# Altium footprint library SMD Active.PcbLib: 76 footprints (part 6 of 8)
Each footprint in its own frame and in the unit in brackets; x right, y up, seen from the top. Pads: shape width x height; smd on the part's side, far side on the other; paste and mask are expansions set on the pad; w line width, h text height; cw(c..) or ccw(c..) is an arc to the next point about the centre after c.
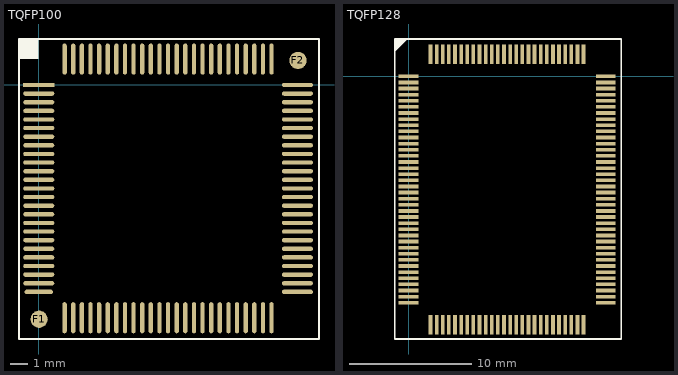
[diagram p5: the footprints below, top view; thin cyan lines are the x and y axes]

## TQFP100 [mm]
pads (102):
  rect 1.8x0.25 smd: 1(0,0)
  oval 1.8x0.25 smd: 2(0,-0.5) 3(0,-1) 4(0,-1.5) 5(0,-2) 6(0,-2.5) 7(0,-3) 8(0,-3.5) 9(0,-4) 10(0,-4.5) 11(0,-5) 12(0,-5.5) 13(0,-6) 14(0,-6.5) 15(0,-7) 16(0,-7.5) 17(0,-8) 18(0,-8.5) 19(0,-9) 20(0,-9.5) 21(0,-10) 22(0,-10.5) 23(0,-11) 24(0,-11.5) 51(15,-12) 52(15,-11.5) 53(15,-11) 54(15,-10.5) 55(15,-10) 56(15,-9.5) 57(15,-9) 58(15,-8.5) 59(15,-8) 60(15,-7.5) 61(15,-7) 62(15,-6.5) 63(15,-6) 64(15,-5.5) 65(15,-5) 66(15,-4.5) 67(15,-4) 68(15,-3.5) 69(15,-3) 70(15,-2.5) 71(15,-2) 72(15,-1.5) 73(15,-1) 74(15,-0.5) 75(15,0)
  oval 1.651x0.25 smd: 25(0,-12)
  oval 0.25x1.8 smd: 26(1.5,-13.5) 27(2,-13.5) 28(2.5,-13.5) 29(3,-13.5) 30(3.5,-13.5) 31(4,-13.5) 32(4.5,-13.5) 33(5,-13.5) 34(5.5,-13.5) 35(6,-13.5) 36(6.5,-13.5) 37(7,-13.5) 38(7.5,-13.5) 39(8,-13.5) 40(8.5,-13.5) 41(9,-13.5) 42(9.5,-13.5) 43(10,-13.5) 44(10.5,-13.5) 45(11,-13.5) 46(11.5,-13.5) 47(12,-13.5) 48(12.5,-13.5) 49(13,-13.5) 50(13.5,-13.5) 76(13.5,1.5) 77(13,1.5) 78(12.5,1.5) 79(12,1.5) 80(11.5,1.5) 81(11,1.5) 82(10.5,1.5) 83(10,1.5) 84(9.5,1.5) 85(9,1.5) 86(8.5,1.5) 87(8,1.5) 88(7.5,1.5) 89(7,1.5) 90(6.5,1.5) 91(6,1.5) 92(5.5,1.5) 93(5,1.5) 94(4.5,1.5) 95(4,1.5) 96(3.5,1.5) 97(3,1.5) 98(2.5,1.5) 99(2,1.5) 100(1.5,1.5)
  round 1 smd: F1(0.022,-13.586) F2(15.033,1.425)
Top Overlay:
  rectangle: -1.146,1.499 -0.025,2.667
  lines w0.127: -0.511,2.667 -1.146,2.032 -1.146,2.159 -0.638,2.667 -0.765,2.667 -1.146,2.286 -1.146,2.413 -0.892,2.667 -1.146,2.667 ; -1.146,2.667 -1.146,-14.732 16.253,-14.732 16.253,2.667 -1.146,2.667
3D body: height 1.02, standoff 0, extent 0.889,-12.598 14.097,0.61
3D body: height 0.3, standoff 0, extent -0.254,-0.143 0.305,0.162
3D body: height 0.64, standoff 0.3, extent 0.089,-0.143 0.914,0.162
3D body: height 0.64, standoff 0.3, extent 0.089,-0.643 0.914,-0.338
3D body: height 0.3, standoff 0, extent -0.254,-0.643 0.305,-0.338
3D body: height 0.64, standoff 0.3, extent 0.089,-1.143 0.914,-0.838
3D body: height 0.3, standoff 0, extent -0.254,-1.143 0.305,-0.838
3D body: height 0.64, standoff 0.3, extent 0.089,-1.643 0.914,-1.338
3D body: height 0.3, standoff 0, extent -0.254,-1.643 0.305,-1.338
3D body: height 0.64, standoff 0.3, extent 0.089,-2.143 0.914,-1.838
3D body: height 0.3, standoff 0, extent -0.254,-2.143 0.305,-1.838
3D body: height 0.64, standoff 0.3, extent 0.089,-2.643 0.914,-2.338
3D body: height 0.3, standoff 0, extent -0.254,-2.643 0.305,-2.338
3D body: height 0.3, standoff 0, extent -0.254,-5.643 0.305,-5.338
3D body: height 0.64, standoff 0.3, extent 0.089,-5.643 0.914,-5.338
3D body: height 0.3, standoff 0, extent -0.254,-5.143 0.305,-4.838
3D body: height 0.64, standoff 0.3, extent 0.089,-5.143 0.914,-4.838
3D body: height 0.3, standoff 0, extent -0.254,-4.643 0.305,-4.338
3D body: height 0.64, standoff 0.3, extent 0.089,-4.643 0.914,-4.338
3D body: height 0.3, standoff 0, extent -0.254,-4.143 0.305,-3.838
3D body: height 0.64, standoff 0.3, extent 0.089,-4.143 0.914,-3.838
3D body: height 0.3, standoff 0, extent -0.254,-3.643 0.305,-3.338
3D body: height 0.64, standoff 0.3, extent 0.089,-3.643 0.914,-3.338
3D body: height 0.64, standoff 0.3, extent 0.089,-3.143 0.914,-2.838
3D body: height 0.3, standoff 0, extent -0.254,-3.143 0.305,-2.838
3D body: height 0.3, standoff 0, extent -0.254,-8.643 0.305,-8.338
3D body: height 0.64, standoff 0.3, extent 0.089,-8.643 0.914,-8.338
3D body: height 0.3, standoff 0, extent -0.254,-8.143 0.305,-7.838
3D body: height 0.64, standoff 0.3, extent 0.089,-8.143 0.914,-7.838
3D body: height 0.3, standoff 0, extent -0.254,-7.643 0.305,-7.338
3D body: height 0.64, standoff 0.3, extent 0.089,-7.643 0.914,-7.338
3D body: height 0.3, standoff 0, extent -0.254,-7.143 0.305,-6.838
3D body: height 0.64, standoff 0.3, extent 0.089,-7.143 0.914,-6.838
3D body: height 0.3, standoff 0, extent -0.254,-6.643 0.305,-6.338
3D body: height 0.64, standoff 0.3, extent 0.089,-6.643 0.914,-6.338
3D body: height 0.64, standoff 0.3, extent 0.089,-6.143 0.914,-5.838
3D body: height 0.3, standoff 0, extent -0.254,-6.143 0.305,-5.838
3D body: height 0.3, standoff 0, extent -0.254,-11.643 0.305,-11.338
3D body: height 0.64, standoff 0.3, extent 0.089,-11.643 0.914,-11.338
3D body: height 0.3, standoff 0, extent -0.254,-11.143 0.305,-10.838
3D body: height 0.64, standoff 0.3, extent 0.089,-11.143 0.914,-10.838
3D body: height 0.3, standoff 0, extent -0.254,-10.643 0.305,-10.338
3D body: height 0.64, standoff 0.3, extent 0.089,-10.643 0.914,-10.338
3D body: height 0.3, standoff 0, extent -0.254,-10.143 0.305,-9.838
3D body: height 0.64, standoff 0.3, extent 0.089,-10.143 0.914,-9.838
3D body: height 0.3, standoff 0, extent -0.254,-9.643 0.305,-9.338
3D body: height 0.64, standoff 0.3, extent 0.089,-9.643 0.914,-9.338
3D body: height 0.64, standoff 0.3, extent 0.089,-9.143 0.914,-8.838
3D body: height 0.3, standoff 0, extent -0.254,-9.143 0.305,-8.838
3D body: height 0.64, standoff 0.3, extent 0.089,-12.143 0.914,-11.838
3D body: height 0.3, standoff 0, extent -0.254,-12.143 0.305,-11.838
3D body: height 0.3, standoff 0, extent 13.334,-13.738 13.639,-13.179
3D body: height 0.64, standoff 0.3, extent 13.334,-13.395 13.639,-12.57
3D body: height 0.3, standoff 0, extent 10.334,-13.738 10.639,-13.179
3D body: height 0.64, standoff 0.3, extent 10.334,-13.395 10.639,-12.57
3D body: height 0.64, standoff 0.3, extent 10.834,-13.395 11.139,-12.57
3D body: height 0.3, standoff 0, extent 10.834,-13.738 11.139,-13.179
3D body: height 0.64, standoff 0.3, extent 11.334,-13.395 11.639,-12.57
3D body: height 0.3, standoff 0, extent 11.334,-13.738 11.639,-13.179
3D body: height 0.64, standoff 0.3, extent 11.834,-13.395 12.139,-12.57
3D body: height 0.3, standoff 0, extent 11.834,-13.738 12.139,-13.179
3D body: height 0.64, standoff 0.3, extent 12.334,-13.395 12.639,-12.57
3D body: height 0.3, standoff 0, extent 12.334,-13.738 12.639,-13.179
3D body: height 0.64, standoff 0.3, extent 12.834,-13.395 13.139,-12.57
3D body: height 0.3, standoff 0, extent 12.834,-13.738 13.139,-13.179
3D body: height 0.3, standoff 0, extent 7.334,-13.738 7.639,-13.179
3D body: height 0.64, standoff 0.3, extent 7.334,-13.395 7.639,-12.57
3D body: height 0.64, standoff 0.3, extent 7.834,-13.395 8.139,-12.57
3D body: height 0.3, standoff 0, extent 7.834,-13.738 8.139,-13.179
3D body: height 0.64, standoff 0.3, extent 8.334,-13.395 8.639,-12.57
3D body: height 0.3, standoff 0, extent 8.334,-13.738 8.639,-13.179
3D body: height 0.64, standoff 0.3, extent 8.834,-13.395 9.139,-12.57
3D body: height 0.3, standoff 0, extent 8.834,-13.738 9.139,-13.179
3D body: height 0.64, standoff 0.3, extent 9.334,-13.395 9.639,-12.57
3D body: height 0.3, standoff 0, extent 9.334,-13.738 9.639,-13.179
3D body: height 0.64, standoff 0.3, extent 9.834,-13.395 10.139,-12.57
3D body: height 0.3, standoff 0, extent 9.834,-13.738 10.139,-13.179
3D body: height 0.3, standoff 0, extent 4.334,-13.738 4.639,-13.179
3D body: height 0.64, standoff 0.3, extent 4.334,-13.395 4.639,-12.57
3D body: height 0.64, standoff 0.3, extent 4.834,-13.395 5.139,-12.57
3D body: height 0.3, standoff 0, extent 4.834,-13.738 5.139,-13.179
3D body: height 0.64, standoff 0.3, extent 5.334,-13.395 5.639,-12.57
3D body: height 0.3, standoff 0, extent 5.334,-13.738 5.639,-13.179
3D body: height 0.64, standoff 0.3, extent 5.834,-13.395 6.139,-12.57
3D body: height 0.3, standoff 0, extent 5.834,-13.738 6.139,-13.179
3D body: height 0.64, standoff 0.3, extent 6.334,-13.395 6.639,-12.57
3D body: height 0.3, standoff 0, extent 6.334,-13.738 6.639,-13.179
3D body: height 0.64, standoff 0.3, extent 6.834,-13.395 7.139,-12.57
3D body: height 0.3, standoff 0, extent 6.834,-13.738 7.139,-13.179
3D body: height 0.3, standoff 0, extent 3.834,-13.738 4.139,-13.179
3D body: height 0.64, standoff 0.3, extent 3.834,-13.395 4.139,-12.57
3D body: height 0.3, standoff 0, extent 3.334,-13.738 3.639,-13.179
3D body: height 0.64, standoff 0.3, extent 3.334,-13.395 3.639,-12.57
3D body: height 0.3, standoff 0, extent 2.834,-13.738 3.139,-13.179
3D body: height 0.64, standoff 0.3, extent 2.834,-13.395 3.139,-12.57
3D body: height 0.3, standoff 0, extent 2.334,-13.738 2.639,-13.179
3D body: height 0.64, standoff 0.3, extent 2.334,-13.395 2.639,-12.57
3D body: height 0.3, standoff 0, extent 1.834,-13.738 2.139,-13.179
3D body: height 0.64, standoff 0.3, extent 1.834,-13.395 2.139,-12.57
3D body: height 0.64, standoff 0.3, extent 1.334,-13.395 1.639,-12.57
3D body: height 0.3, standoff 0, extent 1.334,-13.738 1.639,-13.179
3D body: height 0.3, standoff 0, extent 14.675,-2.662 15.234,-2.357
3D body: height 0.64, standoff 0.3, extent 14.066,-2.662 14.891,-2.357
3D body: height 0.64, standoff 0.3, extent 14.066,-2.162 14.891,-1.857
3D body: height 0.3, standoff 0, extent 14.675,-2.162 15.234,-1.857
3D body: height 0.64, standoff 0.3, extent 14.066,-1.662 14.891,-1.357
3D body: height 0.3, standoff 0, extent 14.675,-1.662 15.234,-1.357
3D body: height 0.64, standoff 0.3, extent 14.066,-1.162 14.891,-0.857
3D body: height 0.3, standoff 0, extent 14.675,-1.162 15.234,-0.857
3D body: height 0.64, standoff 0.3, extent 14.066,-0.662 14.891,-0.357
3D body: height 0.3, standoff 0, extent 14.675,-0.662 15.234,-0.357
3D body: height 0.64, standoff 0.3, extent 14.066,-0.162 14.891,0.143
3D body: height 0.3, standoff 0, extent 14.675,-0.162 15.234,0.143
3D body: height 0.3, standoff 0, extent 14.675,-5.662 15.234,-5.357
3D body: height 0.64, standoff 0.3, extent 14.066,-5.662 14.891,-5.357
3D body: height 0.64, standoff 0.3, extent 14.066,-5.162 14.891,-4.857
3D body: height 0.3, standoff 0, extent 14.675,-5.162 15.234,-4.857
3D body: height 0.64, standoff 0.3, extent 14.066,-4.662 14.891,-4.357
3D body: height 0.3, standoff 0, extent 14.675,-4.662 15.234,-4.357
3D body: height 0.64, standoff 0.3, extent 14.066,-4.162 14.891,-3.857
3D body: height 0.3, standoff 0, extent 14.675,-4.162 15.234,-3.857
3D body: height 0.64, standoff 0.3, extent 14.066,-3.662 14.891,-3.357
3D body: height 0.3, standoff 0, extent 14.675,-3.662 15.234,-3.357
3D body: height 0.64, standoff 0.3, extent 14.066,-3.162 14.891,-2.857
3D body: height 0.3, standoff 0, extent 14.675,-3.162 15.234,-2.857
3D body: height 0.3, standoff 0, extent 14.675,-8.662 15.234,-8.357
3D body: height 0.64, standoff 0.3, extent 14.066,-8.662 14.891,-8.357
3D body: height 0.64, standoff 0.3, extent 14.066,-8.162 14.891,-7.857
3D body: height 0.3, standoff 0, extent 14.675,-8.162 15.234,-7.857
3D body: height 0.64, standoff 0.3, extent 14.066,-7.662 14.891,-7.357
3D body: height 0.3, standoff 0, extent 14.675,-7.662 15.234,-7.357
3D body: height 0.64, standoff 0.3, extent 14.066,-7.162 14.891,-6.857
3D body: height 0.3, standoff 0, extent 14.675,-7.162 15.234,-6.857
3D body: height 0.64, standoff 0.3, extent 14.066,-6.662 14.891,-6.357
3D body: height 0.3, standoff 0, extent 14.675,-6.662 15.234,-6.357
3D body: height 0.64, standoff 0.3, extent 14.066,-6.162 14.891,-5.857
3D body: height 0.3, standoff 0, extent 14.675,-6.162 15.234,-5.857
3D body: height 0.3, standoff 0, extent 14.675,-11.662 15.234,-11.357
3D body: height 0.64, standoff 0.3, extent 14.066,-11.662 14.891,-11.357
3D body: height 0.64, standoff 0.3, extent 14.066,-11.162 14.891,-10.857
3D body: height 0.3, standoff 0, extent 14.675,-11.162 15.234,-10.857
3D body: height 0.64, standoff 0.3, extent 14.066,-10.662 14.891,-10.357
3D body: height 0.3, standoff 0, extent 14.675,-10.662 15.234,-10.357
3D body: height 0.64, standoff 0.3, extent 14.066,-10.162 14.891,-9.857
3D body: height 0.3, standoff 0, extent 14.675,-10.162 15.234,-9.857
3D body: height 0.64, standoff 0.3, extent 14.066,-9.662 14.891,-9.357
3D body: height 0.3, standoff 0, extent 14.675,-9.662 15.234,-9.357
3D body: height 0.64, standoff 0.3, extent 14.066,-9.162 14.891,-8.857
3D body: height 0.3, standoff 0, extent 14.675,-9.162 15.234,-8.857
3D body: height 0.64, standoff 0.3, extent 14.066,-12.162 14.891,-11.857
3D body: height 0.3, standoff 0, extent 14.675,-12.162 15.234,-11.857
3D body: height 0.3, standoff 0, extent 3.853,1.191 4.158,1.75
3D body: height 0.64, standoff 0.3, extent 3.853,0.582 4.158,1.407
3D body: height 0.64, standoff 0.3, extent 3.353,0.582 3.658,1.407
3D body: height 0.3, standoff 0, extent 3.353,1.191 3.658,1.75
3D body: height 0.64, standoff 0.3, extent 2.853,0.582 3.158,1.407
3D body: height 0.3, standoff 0, extent 2.853,1.191 3.158,1.75
3D body: height 0.64, standoff 0.3, extent 2.353,0.582 2.658,1.407
3D body: height 0.3, standoff 0, extent 2.353,1.191 2.658,1.75
3D body: height 0.64, standoff 0.3, extent 1.853,0.582 2.158,1.407
3D body: height 0.3, standoff 0, extent 1.853,1.191 2.158,1.75
3D body: height 0.64, standoff 0.3, extent 1.353,0.582 1.658,1.407
3D body: height 0.3, standoff 0, extent 1.353,1.191 1.658,1.75
3D body: height 0.3, standoff 0, extent 6.853,1.191 7.158,1.75
3D body: height 0.64, standoff 0.3, extent 6.853,0.582 7.158,1.407
3D body: height 0.64, standoff 0.3, extent 6.353,0.582 6.658,1.407
3D body: height 0.3, standoff 0, extent 6.353,1.191 6.658,1.75
3D body: height 0.64, standoff 0.3, extent 5.853,0.582 6.158,1.407
3D body: height 0.3, standoff 0, extent 5.853,1.191 6.158,1.75
3D body: height 0.64, standoff 0.3, extent 5.353,0.582 5.658,1.407
3D body: height 0.3, standoff 0, extent 5.353,1.191 5.658,1.75
3D body: height 0.64, standoff 0.3, extent 4.853,0.582 5.158,1.407
3D body: height 0.3, standoff 0, extent 4.853,1.191 5.158,1.75
3D body: height 0.64, standoff 0.3, extent 4.353,0.582 4.658,1.407
3D body: height 0.3, standoff 0, extent 4.353,1.191 4.658,1.75
3D body: height 0.3, standoff 0, extent 9.853,1.191 10.158,1.75
3D body: height 0.64, standoff 0.3, extent 9.853,0.582 10.158,1.407
3D body: height 0.64, standoff 0.3, extent 9.353,0.582 9.658,1.407
3D body: height 0.3, standoff 0, extent 9.353,1.191 9.658,1.75
3D body: height 0.64, standoff 0.3, extent 8.853,0.582 9.158,1.407
3D body: height 0.3, standoff 0, extent 8.853,1.191 9.158,1.75
3D body: height 0.64, standoff 0.3, extent 8.353,0.582 8.658,1.407
3D body: height 0.3, standoff 0, extent 8.353,1.191 8.658,1.75
3D body: height 0.64, standoff 0.3, extent 7.853,0.582 8.158,1.407
3D body: height 0.3, standoff 0, extent 7.853,1.191 8.158,1.75
3D body: height 0.64, standoff 0.3, extent 7.353,0.582 7.658,1.407
3D body: height 0.3, standoff 0, extent 7.353,1.191 7.658,1.75
3D body: height 0.3, standoff 0, extent 12.853,1.191 13.158,1.75
3D body: height 0.64, standoff 0.3, extent 12.853,0.582 13.158,1.407
3D body: height 0.64, standoff 0.3, extent 12.353,0.582 12.658,1.407
3D body: height 0.3, standoff 0, extent 12.353,1.191 12.658,1.75
3D body: height 0.64, standoff 0.3, extent 11.853,0.582 12.158,1.407
3D body: height 0.3, standoff 0, extent 11.853,1.191 12.158,1.75
3D body: height 0.64, standoff 0.3, extent 11.353,0.582 11.658,1.407
3D body: height 0.3, standoff 0, extent 11.353,1.191 11.658,1.75
3D body: height 0.64, standoff 0.3, extent 10.853,0.582 11.158,1.407
3D body: height 0.3, standoff 0, extent 10.853,1.191 11.158,1.75
3D body: height 0.64, standoff 0.3, extent 10.353,0.582 10.658,1.407
3D body: height 0.3, standoff 0, extent 10.353,1.191 10.658,1.75
3D body: height 0.64, standoff 0.3, extent 13.353,0.582 13.658,1.407
3D body: height 0.3, standoff 0, extent 13.353,1.191 13.658,1.75

## TQFP128 [mm]
pads (128):
  rect 1.6x0.3 smd: 1(0,0) 2(0,-0.5) 3(0,-1) 4(0,-1.5) 5(0,-2) 6(0,-2.5) 7(0,-3) 8(0,-3.5) 9(0,-4) 10(0,-4.5) 11(0,-5) 12(0,-5.5) 13(0,-6) 14(0,-6.5) 15(0,-7) 16(0,-7.5) 17(0,-8) 18(0,-8.5) 19(0,-9) 20(0,-9.5) 21(0,-10) 22(0,-10.5) 23(0,-11) 24(0,-11.5) 25(0,-12) 26(0,-12.5) 27(0,-13) 28(0,-13.5) 29(0,-14) 30(0,-14.5) 31(0,-15) 32(0,-15.5) 33(0,-16) 34(0,-16.5) 35(0,-17) 36(0,-17.5) 37(0,-18) 38(0,-18.5) 65(16.1,-18.5) 66(16.1,-18) 67(16.1,-17.5) 68(16.1,-17) 69(16.1,-16.5) 70(16.1,-16) 71(16.1,-15.5) 72(16.1,-15) 73(16.1,-14.5) 74(16.1,-14) 75(16.1,-13.5) 76(16.1,-13) 77(16.1,-12.5) 78(16.1,-12) 79(16.1,-11.5) 80(16.1,-11) 81(16.1,-10.5) 82(16.1,-10) 83(16.1,-9.5) 84(16.1,-9) 85(16.1,-8.5) 86(16.1,-8) 87(16.1,-7.5) 88(16.1,-7) 89(16.1,-6.5) 90(16.1,-6) 91(16.1,-5.5) 92(16.1,-5) 93(16.1,-4.5) 94(16.1,-4) 95(16.1,-3.5) 96(16.1,-3) 97(16.1,-2.5) 98(16.1,-2) 99(16.1,-1.5) 100(16.1,-1) 101(16.1,-0.5) 102(16.1,0)
  rect 0.3x1.6 smd: 39(1.8,-20.3) 40(2.3,-20.3) 41(2.8,-20.3) 42(3.3,-20.3) 43(3.8,-20.3) 44(4.3,-20.3) 45(4.8,-20.3) 46(5.3,-20.3) 47(5.8,-20.3) 48(6.3,-20.3) 49(6.8,-20.3) 50(7.3,-20.3) 51(7.8,-20.3) 52(8.3,-20.3) 53(8.8,-20.3) 54(9.3,-20.3) 55(9.8,-20.3) 56(10.3,-20.3) 57(10.8,-20.3) 58(11.3,-20.3) 59(11.8,-20.3) 60(12.3,-20.3) 61(12.8,-20.3) 62(13.3,-20.3) 63(13.8,-20.3) 64(14.3,-20.3) 103(14.3,1.8) 104(13.8,1.8) 105(13.3,1.8) 106(12.8,1.8) 107(12.3,1.8) 108(11.8,1.8) 109(11.3,1.8) 110(10.8,1.8) 111(10.3,1.8) 112(9.8,1.8) 113(9.3,1.8) 114(8.8,1.8) 115(8.3,1.8) 116(7.8,1.8) 117(7.3,1.8) 118(6.8,1.8) 119(6.3,1.8) 120(5.8,1.8) 121(5.3,1.8) 122(4.8,1.8) 123(4.3,1.8) 124(3.8,1.8) 125(3.3,1.8) 126(2.8,1.8) 127(2.3,1.8) 128(1.8,1.8)
Top Overlay:
  lines w0.102: -0.931,2.879 -1.143,3.048 -1.143,2.794 -0.889,3.048 -0.762,3.048 -1.143,2.667 -1.143,2.54 -0.635,3.048 -0.508,3.048 -1.143,2.413 -1.143,2.286 -0.381,3.048 -0.254,3.048 -1.143,2.159 -1.143,2.032 -0.127,3.048
  lines w0.127: -1.143,-21.463 17.399,-21.463 17.399,3.048 -1.143,3.048 -1.143,-21.463
3D body: height 0.64, standoff 0.3, extent 15.109,-18.662 15.935,-18.357
3D body: height 0.3, standoff 0, extent 15.719,-18.662 16.278,-18.357
3D body: height 0.64, standoff 0.3, extent 15.109,-18.162 15.935,-17.857
3D body: height 0.3, standoff 0, extent 15.719,-18.162 16.278,-17.857
3D body: height 0.64, standoff 0.3, extent 15.109,-17.662 15.935,-17.357
3D body: height 0.3, standoff 0, extent 15.719,-17.662 16.278,-17.357
3D body: height 0.64, standoff 0.3, extent 15.109,-17.162 15.935,-16.857
3D body: height 0.3, standoff 0, extent 15.719,-17.162 16.278,-16.857
3D body: height 0.64, standoff 0.3, extent 15.109,-16.662 15.935,-16.357
3D body: height 0.3, standoff 0, extent 15.719,-16.662 16.278,-16.357
3D body: height 0.64, standoff 0.3, extent 15.109,-16.162 15.935,-15.857
3D body: height 0.3, standoff 0, extent 15.719,-16.162 16.278,-15.857
3D body: height 0.64, standoff 0.3, extent 15.109,-15.662 15.935,-15.357
3D body: height 0.3, standoff 0, extent 15.719,-15.662 16.278,-15.357
3D body: height 0.64, standoff 0.3, extent 15.109,-15.162 15.935,-14.857
3D body: height 0.3, standoff 0, extent 15.719,-15.162 16.278,-14.857
3D body: height 0.64, standoff 0.3, extent 15.109,-14.662 15.935,-14.357
3D body: height 0.3, standoff 0, extent 15.719,-14.662 16.278,-14.357
3D body: height 0.3, standoff 0, extent 15.719,-10.162 16.278,-9.857
3D body: height 0.64, standoff 0.3, extent 15.109,-10.162 15.935,-9.857
3D body: height 0.3, standoff 0, extent 15.719,-10.662 16.278,-10.357
3D body: height 0.64, standoff 0.3, extent 15.109,-10.662 15.935,-10.357
3D body: height 0.3, standoff 0, extent 15.719,-11.162 16.278,-10.857
3D body: height 0.64, standoff 0.3, extent 15.109,-11.162 15.935,-10.857
3D body: height 0.3, standoff 0, extent 15.719,-11.662 16.278,-11.357
3D body: height 0.64, standoff 0.3, extent 15.109,-11.662 15.935,-11.357
3D body: height 0.3, standoff 0, extent 15.719,-12.162 16.278,-11.857
3D body: height 0.64, standoff 0.3, extent 15.109,-12.162 15.935,-11.857
3D body: height 0.3, standoff 0, extent 15.719,-12.662 16.278,-12.357
3D body: height 0.64, standoff 0.3, extent 15.109,-12.662 15.935,-12.357
3D body: height 0.3, standoff 0, extent 15.719,-13.162 16.278,-12.857
3D body: height 0.64, standoff 0.3, extent 15.109,-13.162 15.935,-12.857
3D body: height 0.3, standoff 0, extent 15.719,-13.662 16.278,-13.357
3D body: height 0.64, standoff 0.3, extent 15.109,-13.662 15.935,-13.357
3D body: height 0.3, standoff 0, extent 15.719,-14.162 16.278,-13.857
3D body: height 0.64, standoff 0.3, extent 15.109,-14.162 15.935,-13.857
3D body: height 0.3, standoff 0, extent 15.719,-5.662 16.278,-5.357
3D body: height 0.64, standoff 0.3, extent 15.109,-5.662 15.935,-5.357
3D body: height 0.3, standoff 0, extent 15.719,-6.162 16.278,-5.857
3D body: height 0.64, standoff 0.3, extent 15.109,-6.162 15.935,-5.857
3D body: height 0.3, standoff 0, extent 15.719,-6.662 16.278,-6.357
3D body: height 0.64, standoff 0.3, extent 15.109,-6.662 15.935,-6.357
3D body: height 0.3, standoff 0, extent 15.719,-7.162 16.278,-6.857
3D body: height 0.64, standoff 0.3, extent 15.109,-7.162 15.935,-6.857
3D body: height 0.3, standoff 0, extent 15.719,-7.662 16.278,-7.357
3D body: height 0.64, standoff 0.3, extent 15.109,-7.662 15.935,-7.357
3D body: height 0.3, standoff 0, extent 15.719,-8.162 16.278,-7.857
3D body: height 0.64, standoff 0.3, extent 15.109,-8.162 15.935,-7.857
3D body: height 0.3, standoff 0, extent 15.719,-8.662 16.278,-8.357
3D body: height 0.64, standoff 0.3, extent 15.109,-8.662 15.935,-8.357
3D body: height 0.3, standoff 0, extent 15.719,-9.162 16.278,-8.857
3D body: height 0.64, standoff 0.3, extent 15.109,-9.162 15.935,-8.857
3D body: height 0.3, standoff 0, extent 15.719,-9.662 16.278,-9.357
3D body: height 0.64, standoff 0.3, extent 15.109,-9.662 15.935,-9.357
3D body: height 0.3, standoff 0, extent 15.719,-1.162 16.278,-0.857
3D body: height 0.64, standoff 0.3, extent 15.109,-1.162 15.935,-0.857
3D body: height 0.3, standoff 0, extent 15.719,-1.662 16.278,-1.357
3D body: height 0.64, standoff 0.3, extent 15.109,-1.662 15.935,-1.357
3D body: height 0.3, standoff 0, extent 15.719,-2.162 16.278,-1.857
3D body: height 0.64, standoff 0.3, extent 15.109,-2.162 15.935,-1.857
3D body: height 0.3, standoff 0, extent 15.719,-2.662 16.278,-2.357
3D body: height 0.64, standoff 0.3, extent 15.109,-2.662 15.935,-2.357
3D body: height 0.3, standoff 0, extent 15.719,-3.162 16.278,-2.857
3D body: height 0.64, standoff 0.3, extent 15.109,-3.162 15.935,-2.857
3D body: height 0.3, standoff 0, extent 15.719,-3.662 16.278,-3.357
3D body: height 0.64, standoff 0.3, extent 15.109,-3.662 15.935,-3.357
3D body: height 0.3, standoff 0, extent 15.719,-4.162 16.278,-3.857
3D body: height 0.64, standoff 0.3, extent 15.109,-4.162 15.935,-3.857
3D body: height 0.3, standoff 0, extent 15.719,-4.662 16.278,-4.357
3D body: height 0.64, standoff 0.3, extent 15.109,-4.662 15.935,-4.357
3D body: height 0.3, standoff 0, extent 15.719,-5.162 16.278,-4.857
3D body: height 0.64, standoff 0.3, extent 15.109,-5.162 15.935,-4.857
3D body: height 0.3, standoff 0, extent 15.719,-0.162 16.278,0.143
3D body: height 0.64, standoff 0.3, extent 15.109,-0.162 15.935,0.143
3D body: height 0.3, standoff 0, extent 15.719,-0.662 16.278,-0.357
3D body: height 0.64, standoff 0.3, extent 15.109,-0.662 15.935,-0.357
3D body: height 0.3, standoff 0, extent 10.157,1.419 10.462,1.978
3D body: height 0.64, standoff 0.3, extent 10.157,0.809 10.462,1.635
3D body: height 0.3, standoff 0, extent 10.657,1.419 10.962,1.978
3D body: height 0.64, standoff 0.3, extent 10.657,0.809 10.962,1.635
3D body: height 0.3, standoff 0, extent 11.157,1.419 11.462,1.978
3D body: height 0.64, standoff 0.3, extent 11.157,0.809 11.462,1.635
3D body: height 0.3, standoff 0, extent 11.657,1.419 11.962,1.978
3D body: height 0.64, standoff 0.3, extent 11.657,0.809 11.962,1.635
3D body: height 0.3, standoff 0, extent 12.157,1.419 12.462,1.978
3D body: height 0.64, standoff 0.3, extent 12.157,0.809 12.462,1.635
3D body: height 0.3, standoff 0, extent 12.657,1.419 12.962,1.978
3D body: height 0.64, standoff 0.3, extent 12.657,0.809 12.962,1.635
3D body: height 0.3, standoff 0, extent 13.157,1.419 13.462,1.978
3D body: height 0.64, standoff 0.3, extent 13.157,0.809 13.462,1.635
3D body: height 0.3, standoff 0, extent 13.657,1.419 13.962,1.978
3D body: height 0.64, standoff 0.3, extent 13.657,0.809 13.962,1.635
3D body: height 0.3, standoff 0, extent 14.157,1.419 14.462,1.978
3D body: height 0.64, standoff 0.3, extent 14.157,0.809 14.462,1.635
3D body: height 0.3, standoff 0, extent 5.657,1.419 5.962,1.978
3D body: height 0.64, standoff 0.3, extent 5.657,0.809 5.962,1.635
3D body: height 0.3, standoff 0, extent 6.157,1.419 6.462,1.978
3D body: height 0.64, standoff 0.3, extent 6.157,0.809 6.462,1.635
3D body: height 0.3, standoff 0, extent 6.657,1.419 6.962,1.978
3D body: height 0.64, standoff 0.3, extent 6.657,0.809 6.962,1.635
3D body: height 0.3, standoff 0, extent 7.157,1.419 7.462,1.978
3D body: height 0.64, standoff 0.3, extent 7.157,0.809 7.462,1.635
3D body: height 0.3, standoff 0, extent 7.657,1.419 7.962,1.978
3D body: height 0.64, standoff 0.3, extent 7.657,0.809 7.962,1.635
3D body: height 0.3, standoff 0, extent 8.157,1.419 8.462,1.978
3D body: height 0.64, standoff 0.3, extent 8.157,0.809 8.462,1.635
3D body: height 0.3, standoff 0, extent 8.657,1.419 8.962,1.978
3D body: height 0.64, standoff 0.3, extent 8.657,0.809 8.962,1.635
3D body: height 0.3, standoff 0, extent 9.157,1.419 9.462,1.978
3D body: height 0.64, standoff 0.3, extent 9.157,0.809 9.462,1.635
3D body: height 0.3, standoff 0, extent 9.657,1.419 9.962,1.978
3D body: height 0.64, standoff 0.3, extent 9.657,0.809 9.962,1.635
3D body: height 0.3, standoff 0, extent 1.657,1.419 1.962,1.978
3D body: height 0.64, standoff 0.3, extent 1.657,0.809 1.962,1.635
3D body: height 0.3, standoff 0, extent 2.157,1.419 2.462,1.978
3D body: height 0.64, standoff 0.3, extent 2.157,0.809 2.462,1.635
3D body: height 0.3, standoff 0, extent 2.657,1.419 2.962,1.978
3D body: height 0.64, standoff 0.3, extent 2.657,0.809 2.962,1.635
3D body: height 0.3, standoff 0, extent 3.157,1.419 3.462,1.978
3D body: height 0.64, standoff 0.3, extent 3.157,0.809 3.462,1.635
3D body: height 0.3, standoff 0, extent 3.657,1.419 3.962,1.978
3D body: height 0.64, standoff 0.3, extent 3.657,0.809 3.962,1.635
3D body: height 0.3, standoff 0, extent 4.157,1.419 4.462,1.978
3D body: height 0.64, standoff 0.3, extent 4.157,0.809 4.462,1.635
3D body: height 0.3, standoff 0, extent 4.657,1.419 4.962,1.978
3D body: height 0.64, standoff 0.3, extent 4.657,0.809 4.962,1.635
3D body: height 0.3, standoff 0, extent 5.157,1.419 5.462,1.978
3D body: height 0.64, standoff 0.3, extent 5.157,0.809 5.462,1.635
3D body: height 0.64, standoff 0.3, extent 10.638,-20.135 10.943,-19.309
3D body: height 0.3, standoff 0, extent 10.638,-20.478 10.943,-19.919
3D body: height 0.64, standoff 0.3, extent 11.138,-20.135 11.443,-19.309
3D body: height 0.3, standoff 0, extent 11.138,-20.478 11.443,-19.919
3D body: height 0.64, standoff 0.3, extent 11.638,-20.135 11.943,-19.309
3D body: height 0.3, standoff 0, extent 11.638,-20.478 11.943,-19.919
3D body: height 0.64, standoff 0.3, extent 12.138,-20.135 12.443,-19.309
3D body: height 0.3, standoff 0, extent 12.138,-20.478 12.443,-19.919
3D body: height 0.64, standoff 0.3, extent 12.638,-20.135 12.943,-19.309
3D body: height 0.3, standoff 0, extent 12.638,-20.478 12.943,-19.919
3D body: height 0.64, standoff 0.3, extent 13.138,-20.135 13.443,-19.309
3D body: height 0.3, standoff 0, extent 13.138,-20.478 13.443,-19.919
3D body: height 0.64, standoff 0.3, extent 13.638,-20.135 13.943,-19.309
3D body: height 0.3, standoff 0, extent 13.638,-20.478 13.943,-19.919
3D body: height 0.64, standoff 0.3, extent 14.138,-20.135 14.443,-19.309
3D body: height 0.3, standoff 0, extent 14.138,-20.478 14.443,-19.919
3D body: height 0.64, standoff 0.3, extent 6.138,-20.135 6.443,-19.309
3D body: height 0.3, standoff 0, extent 6.138,-20.478 6.443,-19.919
3D body: height 0.64, standoff 0.3, extent 6.638,-20.135 6.943,-19.309
3D body: height 0.3, standoff 0, extent 6.638,-20.478 6.943,-19.919
3D body: height 0.64, standoff 0.3, extent 7.138,-20.135 7.443,-19.309
3D body: height 0.3, standoff 0, extent 7.138,-20.478 7.443,-19.919
3D body: height 0.64, standoff 0.3, extent 7.638,-20.135 7.943,-19.309
3D body: height 0.3, standoff 0, extent 7.638,-20.478 7.943,-19.919
3D body: height 0.64, standoff 0.3, extent 8.138,-20.135 8.443,-19.309
3D body: height 0.3, standoff 0, extent 8.138,-20.478 8.443,-19.919
3D body: height 0.64, standoff 0.3, extent 8.638,-20.135 8.943,-19.309
3D body: height 0.3, standoff 0, extent 8.638,-20.478 8.943,-19.919
3D body: height 0.64, standoff 0.3, extent 9.138,-20.135 9.443,-19.309
3D body: height 0.3, standoff 0, extent 9.138,-20.478 9.443,-19.919
3D body: height 0.64, standoff 0.3, extent 9.638,-20.135 9.943,-19.309
3D body: height 0.3, standoff 0, extent 9.638,-20.478 9.943,-19.919
3D body: height 0.64, standoff 0.3, extent 10.138,-20.135 10.443,-19.309
3D body: height 0.3, standoff 0, extent 10.138,-20.478 10.443,-19.919
3D body: height 0.64, standoff 0.3, extent 1.638,-20.135 1.943,-19.309
3D body: height 0.3, standoff 0, extent 1.638,-20.478 1.943,-19.919
3D body: height 0.64, standoff 0.3, extent 2.138,-20.135 2.443,-19.309
3D body: height 0.3, standoff 0, extent 2.138,-20.478 2.443,-19.919
3D body: height 0.64, standoff 0.3, extent 2.638,-20.135 2.943,-19.309
3D body: height 0.3, standoff 0, extent 2.638,-20.478 2.943,-19.919
3D body: height 0.64, standoff 0.3, extent 3.138,-20.135 3.443,-19.309
3D body: height 0.3, standoff 0, extent 3.138,-20.478 3.443,-19.919
3D body: height 0.64, standoff 0.3, extent 3.638,-20.135 3.943,-19.309
3D body: height 0.3, standoff 0, extent 3.638,-20.478 3.943,-19.919
3D body: height 0.64, standoff 0.3, extent 4.138,-20.135 4.443,-19.309
3D body: height 0.3, standoff 0, extent 4.138,-20.478 4.443,-19.919
3D body: height 0.64, standoff 0.3, extent 4.638,-20.135 4.943,-19.309
3D body: height 0.3, standoff 0, extent 4.638,-20.478 4.943,-19.919
3D body: height 0.64, standoff 0.3, extent 5.138,-20.135 5.443,-19.309
3D body: height 0.3, standoff 0, extent 5.138,-20.478 5.443,-19.919
3D body: height 0.64, standoff 0.3, extent 5.638,-20.135 5.943,-19.309
3D body: height 0.3, standoff 0, extent 5.638,-20.478 5.943,-19.919
3D body: height 0.64, standoff 0.3, extent 0.165,-18.143 0.991,-17.838
3D body: height 0.3, standoff 0, extent -0.178,-18.143 0.381,-17.838
3D body: height 0.64, standoff 0.3, extent 0.165,-18.643 0.991,-18.338
3D body: height 0.3, standoff 0, extent -0.178,-18.643 0.381,-18.338
3D body: height 0.64, standoff 0.3, extent 0.165,-13.643 0.991,-13.338
3D body: height 0.3, standoff 0, extent -0.178,-13.643 0.381,-13.338
3D body: height 0.64, standoff 0.3, extent 0.165,-14.143 0.991,-13.838
3D body: height 0.3, standoff 0, extent -0.178,-14.143 0.381,-13.838
3D body: height 0.64, standoff 0.3, extent 0.165,-14.643 0.991,-14.338
3D body: height 0.3, standoff 0, extent -0.178,-14.643 0.381,-14.338
3D body: height 0.64, standoff 0.3, extent 0.165,-15.143 0.991,-14.838
3D body: height 0.3, standoff 0, extent -0.178,-15.143 0.381,-14.838
3D body: height 0.64, standoff 0.3, extent 0.165,-15.643 0.991,-15.338
3D body: height 0.3, standoff 0, extent -0.178,-15.643 0.381,-15.338
3D body: height 0.64, standoff 0.3, extent 0.165,-16.143 0.991,-15.838
3D body: height 0.3, standoff 0, extent -0.178,-16.143 0.381,-15.838
3D body: height 0.64, standoff 0.3, extent 0.165,-16.643 0.991,-16.338
3D body: height 0.3, standoff 0, extent -0.178,-16.643 0.381,-16.338
3D body: height 0.64, standoff 0.3, extent 0.165,-17.143 0.991,-16.838
3D body: height 0.3, standoff 0, extent -0.178,-17.143 0.381,-16.838
3D body: height 0.64, standoff 0.3, extent 0.165,-17.643 0.991,-17.338
3D body: height 0.3, standoff 0, extent -0.178,-17.643 0.381,-17.338
3D body: height 0.64, standoff 0.3, extent 0.165,-9.143 0.991,-8.838
3D body: height 0.3, standoff 0, extent -0.178,-9.143 0.381,-8.838
3D body: height 0.64, standoff 0.3, extent 0.165,-9.643 0.991,-9.338
3D body: height 0.3, standoff 0, extent -0.178,-9.643 0.381,-9.338
3D body: height 0.64, standoff 0.3, extent 0.165,-10.143 0.991,-9.838
3D body: height 0.3, standoff 0, extent -0.178,-10.143 0.381,-9.838
3D body: height 0.64, standoff 0.3, extent 0.165,-10.643 0.991,-10.338
3D body: height 0.3, standoff 0, extent -0.178,-10.643 0.381,-10.338
3D body: height 0.64, standoff 0.3, extent 0.165,-11.143 0.991,-10.838
3D body: height 0.3, standoff 0, extent -0.178,-11.143 0.381,-10.838
3D body: height 0.64, standoff 0.3, extent 0.165,-11.643 0.991,-11.338
3D body: height 0.3, standoff 0, extent -0.178,-11.643 0.381,-11.338
3D body: height 0.64, standoff 0.3, extent 0.165,-12.143 0.991,-11.838
3D body: height 0.3, standoff 0, extent -0.178,-12.143 0.381,-11.838
3D body: height 0.64, standoff 0.3, extent 0.165,-12.643 0.991,-12.338
3D body: height 0.3, standoff 0, extent -0.178,-12.643 0.381,-12.338
3D body: height 0.64, standoff 0.3, extent 0.165,-13.143 0.991,-12.838
3D body: height 0.3, standoff 0, extent -0.178,-13.143 0.381,-12.838
3D body: height 0.64, standoff 0.3, extent 0.165,-4.643 0.991,-4.338
3D body: height 0.3, standoff 0, extent -0.178,-4.643 0.381,-4.338
3D body: height 0.64, standoff 0.3, extent 0.165,-5.143 0.991,-4.838
3D body: height 0.3, standoff 0, extent -0.178,-5.143 0.381,-4.838
3D body: height 0.64, standoff 0.3, extent 0.165,-5.643 0.991,-5.338
3D body: height 0.3, standoff 0, extent -0.178,-5.643 0.381,-5.338
3D body: height 0.64, standoff 0.3, extent 0.165,-6.143 0.991,-5.838
3D body: height 0.3, standoff 0, extent -0.178,-6.143 0.381,-5.838
3D body: height 0.64, standoff 0.3, extent 0.165,-6.643 0.991,-6.338
3D body: height 0.3, standoff 0, extent -0.178,-6.643 0.381,-6.338
3D body: height 0.64, standoff 0.3, extent 0.165,-7.143 0.991,-6.838
3D body: height 0.3, standoff 0, extent -0.178,-7.143 0.381,-6.838
3D body: height 0.64, standoff 0.3, extent 0.165,-7.643 0.991,-7.338
3D body: height 0.3, standoff 0, extent -0.178,-7.643 0.381,-7.338
3D body: height 0.64, standoff 0.3, extent 0.165,-8.143 0.991,-7.838
3D body: height 0.3, standoff 0, extent -0.178,-8.143 0.381,-7.838
3D body: height 0.64, standoff 0.3, extent 0.165,-8.643 0.991,-8.338
3D body: height 0.3, standoff 0, extent -0.178,-8.643 0.381,-8.338
3D body: height 0.3, standoff 0, extent -0.178,-4.143 0.381,-3.838
3D body: height 0.64, standoff 0.3, extent 0.165,-4.143 0.991,-3.838
3D body: height 0.3, standoff 0, extent -0.178,-3.643 0.381,-3.338
3D body: height 0.64, standoff 0.3, extent 0.165,-3.643 0.991,-3.338
3D body: height 0.3, standoff 0, extent -0.178,-3.143 0.381,-2.838
3D body: height 0.64, standoff 0.3, extent 0.165,-3.143 0.991,-2.838
3D body: height 0.3, standoff 0, extent -0.178,-2.643 0.381,-2.338
3D body: height 0.64, standoff 0.3, extent 0.165,-2.643 0.991,-2.338
3D body: height 0.3, standoff 0, extent -0.178,-2.143 0.381,-1.838
3D body: height 0.64, standoff 0.3, extent 0.165,-2.143 0.991,-1.838
3D body: height 0.3, standoff 0, extent -0.178,-1.643 0.381,-1.338
3D body: height 0.64, standoff 0.3, extent 0.165,-1.643 0.991,-1.338
3D body: height 0.3, standoff 0, extent -0.178,-1.143 0.381,-0.838
3D body: height 0.64, standoff 0.3, extent 0.165,-1.143 0.991,-0.838
3D body: height 0.3, standoff 0, extent -0.178,-0.643 0.381,-0.338
3D body: height 0.64, standoff 0.3, extent 0.165,-0.643 0.991,-0.338
3D body: height 0.3, standoff 0, extent -0.178,-0.143 0.381,0.162
3D body: height 0.64, standoff 0.3, extent 0.165,-0.143 0.991,0.162
3D body: height 1.02, standoff 0, extent 0.815,-19.329 15.138,0.838